# Altium footprint library Components.PcbLib: 139 footprints (part 4 of 9)
Each footprint in its own frame and in the unit in brackets; x right, y up, seen from the top. Pads: shape width x height; smd on the part's side, far side on the other; paste and mask are expansions set on the pad; w line width, h text height; cw(c..) or ccw(c..) is an arc to the next point about the centre after c.
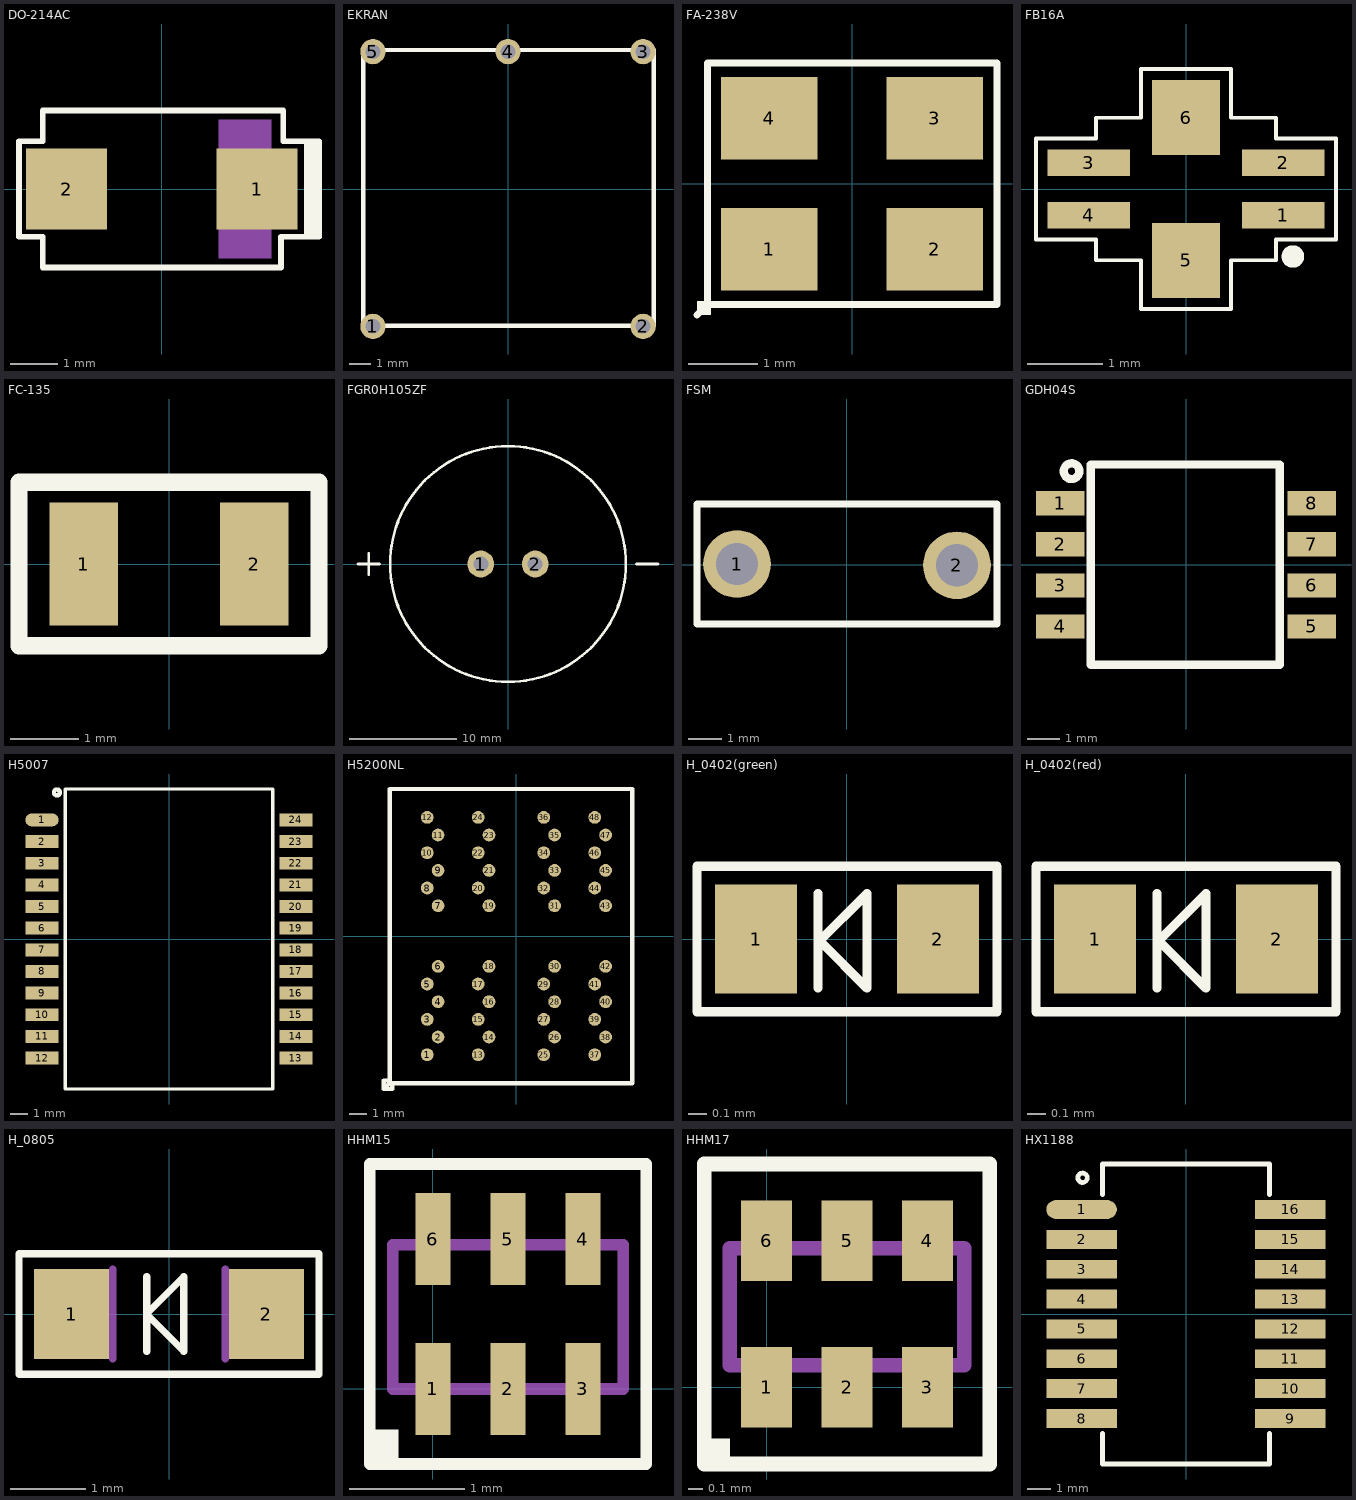
[diagram p3: the footprints below, top view; thin cyan lines are the x and y axes]

## DO-214AC [mm]
pads (2):
  rect 1.7x1.7 smd paste-0.18 mask+0.05: 1(2,0) 2(-2,0)
Top Overlay:
  lines w0.12: 3.05,-1 3.05,1 ; 3.15,-1 3.15,1 ; 3.2,-1 3.2,1 ; -3,-1 -2.5,-1 -2.5,-1.65 2.5,-1.65 2.5,-1 3.3,-1 3.3,1 2.55,1 2.55,1.65 -2.5,1.65 -2.5,1 -3,1 -3,-1
Mechanical 1:
  region: 2.3,-1.45 1.2,-1.45 1.2,1.45 2.3,1.45
3D body "SW3dPS-S1G.STEP": height 2.17, standoff 0.03, extent -2.553,-1.3 2.553,1.367

## EKRAN [mm]
pads (5):
  round 1.2 hole 0.7: 1(-6.415,-6.525) 2(6.415,-6.525) 3(6.415,6.525) 4(0,6.525) 5(-6.415,6.525)
Top Overlay:
  lines w0.2: -6.875,-6.5 -6.875,6.6 6.925,6.6 6.925,-6.5 -6.875,-6.5
3D body: height 1.8, standoff 1.7, extent -6.975,-6.6 7.025,6.7

## FA-238V [mm]
pads (4):
  rect 1.4x1.2 smd paste-0.08 mask+0.08: 1(-1.2,-0.95) 2(1.2,-0.95) 3(1.2,0.95) 4(-1.2,0.95)
Top Overlay:
  rectangle: -2.25,-1.9 -2.05,-1.7
  lines w0.1: -2.25,-1.9 -2.1,-1.75 ; -2.1,-1.75 -2.1,1.75 2.1,1.75 2.1,-1.75 -2.1,-1.75
3D body: height 0.6, standoff 0, extent -1.599,-1.249 1.599,1.25

## FB16A [mm]
pads (6):
  rect 1.1x0.35 smd paste-0.05 mask+0.05: 1(1.3,-0.35) 2(1.3,0.35) 3(-1.3,0.35) 4(-1.3,-0.35)
  rect 0.9x1 smd paste-0.1 mask+0.05: 5(0,-0.95) 6(0,0.95)
Top Overlay:
  circle w0.15: c1.425,-0.9 r0.075
  lines w0.05: -2,-0.675 -1.2,-0.675 -1.2,-0.95 -0.6,-0.95 -0.6,-1.6 0.6,-1.6 0.6,-0.95 1.2,-0.95 1.2,-0.675 2,-0.675 2,0.675 1.2,0.675 1.2,0.95 0.6,0.95 0.6,1.6 -0.6,1.6 -0.6,0.95 -1.2,0.95 -1.2,0.675 -2,0.675 -2,-0.675

## FC-135 [mm]
pads (2):
  rect 1x1.8 smd paste-0.1: 1(-1.25,0) 2(1.25,0)
Top Overlay:
  lines w0.254: -2.2,-1.2 2.2,-1.2 2.2,1.2 2.1,1.2 -2.2,1.2 -2.2,-1.2
3D body: height 1, standoff 0, extent -1.7,-0.85 1.7,0.85

## FGR0H105ZF [mm]
pads (2):
  round 2.5 hole 1.4: 1(-2.54,0) 2(2.54,0)
Top Overlay:
  circle w0.254: c0,0 r11
  lines w0.254: -14,0 -12,0 ; -13,-1 -13,1 ; 12,0 14,0
3D body: height 8, standoff 0, extent -10.999,-10.999 10.999,10.999

## FSM [mm]
pads (2):
  round 2.032 hole 1.27: 1(-3.3,0.02) 2(3.3,-0.02)
Top Overlay:
  lines w0.2: -4.5,-1.78 -4.5,1.82 4.5,1.82 4.5,-1.78 -4.5,-1.78
3D body: height 4, standoff 0, extent -4.499,-1.779 4.499,1.819
3D body: height 5, standoff 0, extent -1.599,-0.679 1.399,0.82

## GDH04S [mm]
pads (8):
  rect 1.5x0.75 smd paste-0.04 mask+0.07: 1(-3.894,1.905) 2(-3.894,0.635) 3(-3.894,-0.635) 4(-3.894,-1.905) 5(3.894,-1.905) 6(3.894,-0.635) 7(3.894,0.635) 8(3.894,1.905)
Top Overlay:
  circle w0.254: c-3.543,2.9 r0.243
  lines w0.254: -2.95,-3.09 -2.95,3.11 2.9,3.11 2.9,-3.09 -2.95,-3.09
3D body "User Library-TDA04.STEP": height 2.35, standoff 0, extent -4.066,-3.1 4.066,3.11

## H5007 [mm] "SOP, 24-Leads, Body 17,6x12,2mm (max), Pitch 1,27mm, IPC Medium Density"
height 5.5
pads (24):
  oval 1.95x0.76 smd paste-0.1: 1(-7.45,6.985)
  rect 1.95x0.76 smd paste-0.1: 2(-7.45,5.715) 3(-7.45,4.445) 4(-7.45,3.175) 5(-7.45,1.905) 6(-7.45,0.635) 7(-7.45,-0.635) 8(-7.45,-1.905) 9(-7.45,-3.175) 10(-7.45,-4.445) 11(-7.45,-5.715) 12(-7.45,-6.985) 13(7.45,-6.985) 14(7.45,-5.715) 15(7.45,-4.445) 16(7.45,-3.175) 17(7.45,-1.905) 18(7.45,-0.635) 19(7.45,0.635) 20(7.45,1.905) 21(7.45,3.175) 22(7.45,4.445) 23(7.45,5.715) 24(7.45,6.985)
Top Overlay:
  circle w0.25: c-6.575,8.6 r0.175
  lines w0.2: -6.075,-8.8 -6.075,8.8 6.075,8.8 6.075,-8.8 -6.075,-8.8
Mechanical 13:
  lines w0.1: -6.1,-8.8 -6.1,8.8 6.1,8.8 6.1,-8.8 -6.1,-8.8
3D body: height 5.5, standoff 0.25, extent -6.1,-8.8 6.1,8.8

## H5200NL [mm]
pads (48):
  round 0.75 smd paste-0.07 mask+0.07: 1(-5.25,-6.985) 2(-4.61,-5.945) 3(-5.25,-4.905) 4(-4.61,-3.865) 5(-5.25,-2.825) 6(-4.61,-1.785) 7(-4.61,1.785) 8(-5.25,2.825) 9(-4.61,3.865) 10(-5.25,4.905) 11(-4.61,5.945) 12(-5.25,6.985) 13(-2.25,-6.985) 14(-1.61,-5.945) 15(-2.25,-4.905) 16(-1.61,-3.865) 17(-2.25,-2.825) 18(-1.61,-1.785) 19(-1.61,1.785) 20(-2.25,2.825) 21(-1.61,3.865) 22(-2.25,4.905) 23(-1.61,5.945) 24(-2.25,6.985) 25(1.61,-6.985) 26(2.25,-5.945) 27(1.61,-4.905) 28(2.25,-3.865) 29(1.61,-2.825) 30(2.25,-1.785) 31(2.25,1.785) 32(1.61,2.825) 33(2.25,3.865) 34(1.61,4.905) 35(2.25,5.945) 36(1.61,6.985) 37(4.61,-6.985) 38(5.25,-5.945) 39(4.61,-4.905) 40(5.25,-3.865) 41(4.61,-2.825) 42(5.25,-1.785) 43(5.25,1.785) 44(4.61,2.825) 45(5.25,3.865) 46(4.61,4.905) 47(5.25,5.945) 48(4.61,6.985)
Top Overlay:
  lines w0.254: -7.798,-9.002 -7.45,-8.655 ; -7.45,-8.5 -7.8,-8.5 -7.8,-9 -7.3,-9 -7.3,-8.655 -7.45,-8.655 ; -7.45,-8.655 -7.45,8.655 6.81,8.655 6.81,-8.655 -7.45,-8.655

## H_0402(green) [mm]
pads (2):
  rect 0.45x0.6 smd paste-0.03 mask+0.04: 1(-0.5,0) 2(0.5,0)
Top Overlay:
  lines w0.05: -0.16,-0.27 -0.16,0.25 ; -0.16,-0.02 0.11,0.25 0.11,-0.27 -0.145,-0.015 ; -0.825,-0.4 -0.825,0 -0.825,0.4 0.825,0.4 0.825,-0.4 -0.825,-0.4
3D body "LED-0402(GREEN).STEP": height 0.45, standoff 0, extent -0.505,-0.25 0.505,0.25

## H_0402(red) [mm]
pads (2):
  rect 0.45x0.6 smd paste-0.03 mask+0.04: 1(-0.5,0) 2(0.5,0)
Top Overlay:
  lines w0.05: -0.16,-0.27 -0.16,0.25 ; -0.16,-0.02 0.11,0.25 0.11,-0.27 -0.145,-0.015 ; -0.825,-0.4 -0.825,0 -0.825,0.4 0.825,0.4 0.825,-0.4 -0.825,-0.4
3D body "LED-0402(RED).STEP": height 0.45, standoff 0, extent -0.505,-0.25 0.505,0.25

## H_0805 [mm]
pads (2):
  rect 1x1.2 smd paste-0.05: 1(-1.3,0) 2(1.3,0)
Top Overlay:
  lines w0.1: -0.3,-0.5 -0.3,0.5 ; -2,-0.8 -2,0.8 2,0.8 2,-0.8 -2,-0.8 ; -0.3,0 0.2,0.5 0.2,-0.5 -0.3,0
Mechanical 1:
  lines w0.1: -0.75,-0.6 -0.75,0.6 ; 0.75,-0.6 0.75,0.6
3D body "LED-0805.STEP": height 1.1, standoff 0, extent -1.01,-0.65 1.01,0.6

## HHM15 [mm]
pads (6):
  rect 0.3x0.8 smd paste-0.04 mask+0.04: 1(0,0) 2(0.65,0) 3(1.3,0) 4(1.3,1.3) 5(0.65,1.3) 6(0,1.3)
Top Overlay:
  rectangle: -0.55,-0.65 -0.3,-0.35
  lines w0.1: -0.55,-0.65 1.85,-0.65 1.85,1.95 -0.55,1.95 -0.55,-0.65
Mechanical 13:
  lines w0.1: -0.35,0 -0.35,1.25 1.65,1.25 1.65,0 -0.35,0

## HHM17 [mm]
pads (6):
  rect 0.35x0.55 smd paste-0.04 mask+0.04: 1(0,0) 2(0.55,0) 3(1.1,0) 4(1.1,1) 5(0.55,1) 6(0,1)
Top Overlay:
  rectangle: -0.425,-0.525 -0.25,-0.35
  lines w0.1: -0.425,-0.525 -0.425,1.525 1.525,1.525 1.525,-0.525 -0.425,-0.525 ; -0.425,-0.525 -0.425,-0.525
Mechanical 13:
  lines w0.1: -0.25,0.15 -0.25,0.95 1.35,0.95 1.35,0.15 -0.25,0.15

## HX1188 [mm]
pads (16):
  oval 3x0.8 smd paste-0.1 mask+0.08: 1(-4.44,4.445)
  rect 3x0.8 smd paste-0.1 mask+0.08: 2(-4.44,3.175) 3(-4.44,1.905) 4(-4.44,0.635) 5(-4.44,-0.635) 6(-4.44,-1.905) 7(-4.44,-3.175) 8(-4.44,-4.445) 9(4.44,-4.445) 10(4.44,-3.175) 11(4.44,-1.905) 12(4.44,-0.635) 13(4.44,0.635) 14(4.44,1.905) 15(4.44,3.175) 16(4.44,4.445)
Top Overlay:
  circle w0.2: c-4.401,5.795 r0.2
  lines w0.2: -3.555,-5.07 -3.555,-6.38 3.555,-6.38 3.555,-5.07 ; -3.555,5.07 -3.555,6.38 3.555,6.38 3.555,5.07
3D body "User Library-Halo_SMD10base-T Module.STEP": height 5.04, standoff 0, extent -4.65,-6.35 4.867,6.35